# Altium footprint library PCB1.PcbLib: 98 footprints (part 4 of 7)
Each footprint in its own frame and in the unit in brackets; x right, y up, seen from the top. Pads: shape width x height; smd on the part's side, far side on the other; paste and mask are expansions set on the pad; w line width, h text height; cw(c..) or ccw(c..) is an arc to the next point about the centre after c.
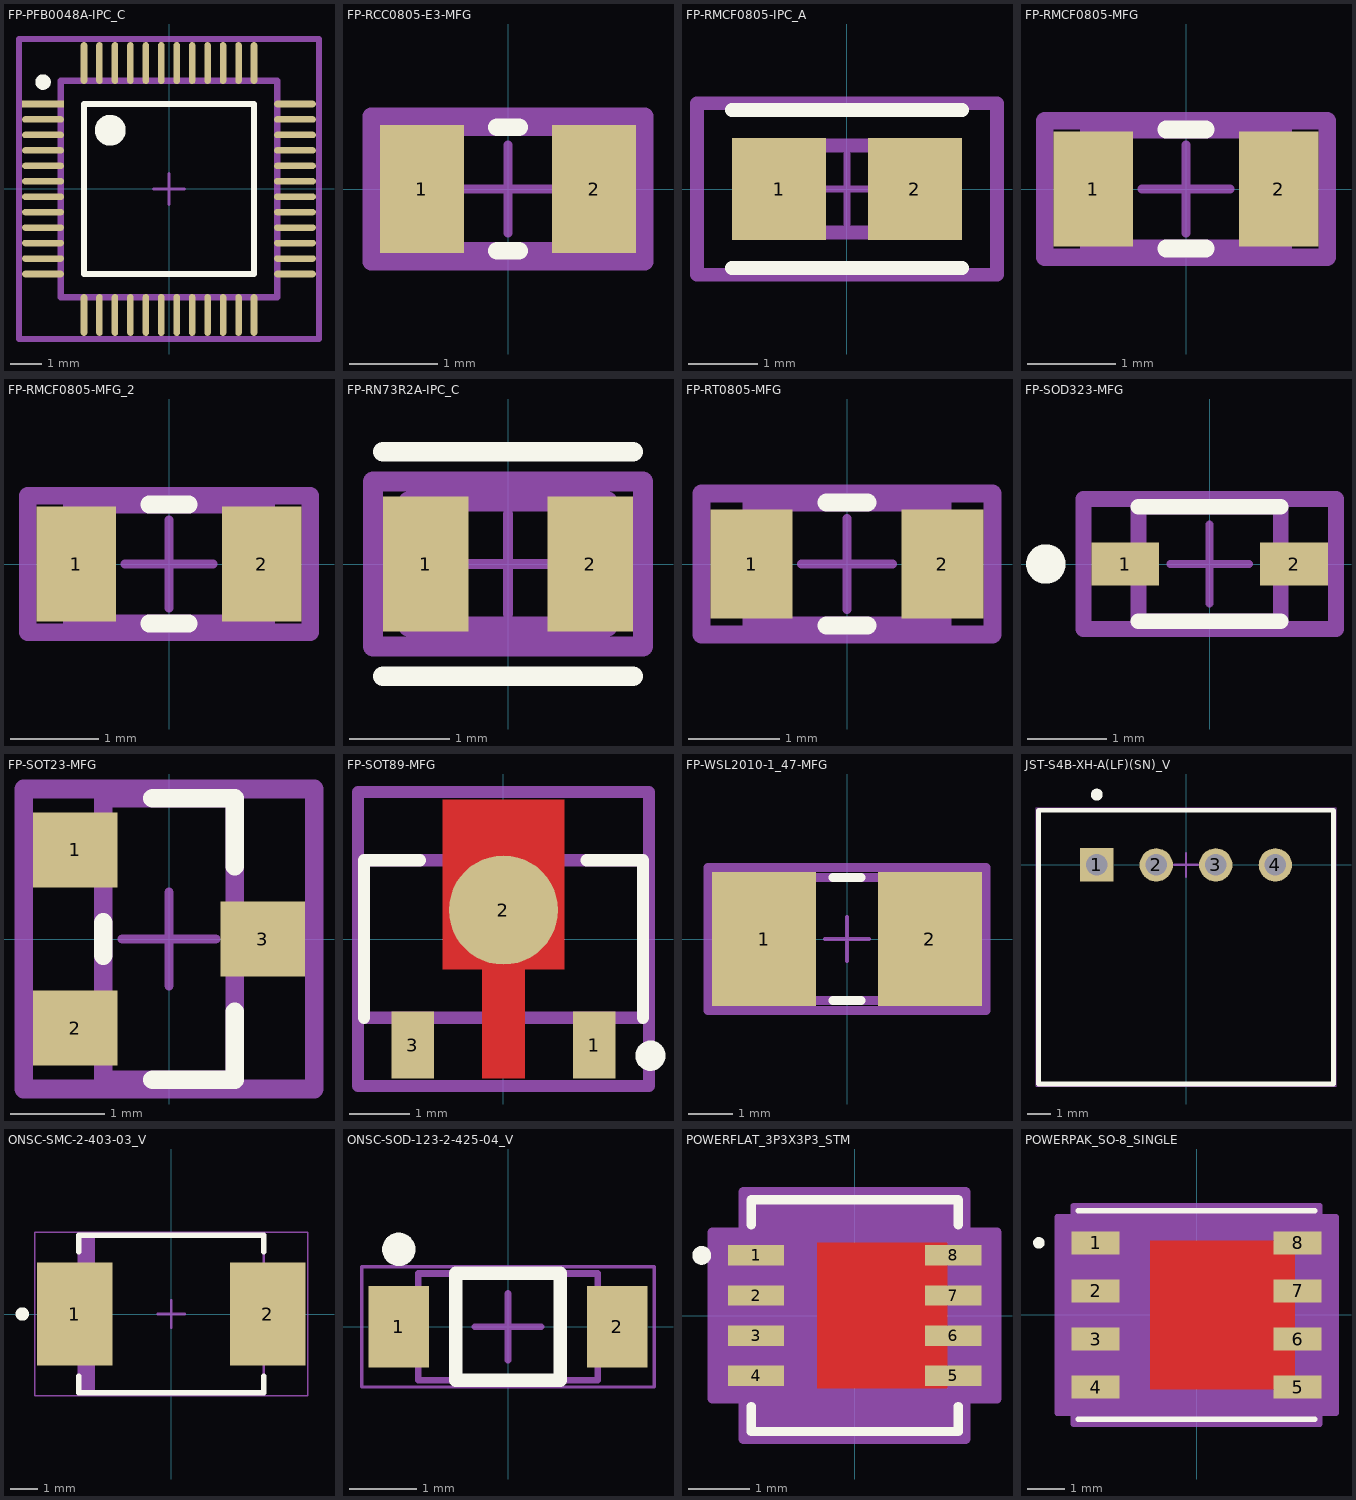
[diagram p3: the footprints below, top view; thin cyan lines are the x and y axes]

## FP-PFB0048A-IPC_C [mm]
pads (48):
  rect 1.355x0.212 smd paste+0 mask+0: 1(-4.075,2.75)
  rrect100% 1.355x0.212 smd paste+0 mask+0: 2(-4.075,2.25) 3(-4.075,1.75) 4(-4.075,1.25) 5(-4.075,0.75) 6(-4.075,0.25) 7(-4.075,-0.25) 8(-4.075,-0.75) 9(-4.075,-1.25) 10(-4.075,-1.75) 11(-4.075,-2.25) 12(-4.075,-2.75) 25(4.075,-2.75) 26(4.075,-2.25) 27(4.075,-1.75) 28(4.075,-1.25) 29(4.075,-0.75) 30(4.075,-0.25) 31(4.075,0.25) 32(4.075,0.75) 33(4.075,1.25) 34(4.075,1.75) 35(4.075,2.25) 36(4.075,2.75)
  rrect100% 0.212x1.355 smd paste+0 mask+0: 13(-2.75,-4.075) 14(-2.25,-4.075) 15(-1.75,-4.075) 16(-1.25,-4.075) 17(-0.75,-4.075) 18(-0.25,-4.075) 19(0.25,-4.075) 20(0.75,-4.075) 21(1.25,-4.075) 22(1.75,-4.075) 23(2.25,-4.075) 24(2.75,-4.075) 37(2.75,4.075) 38(2.25,4.075) 39(1.75,4.075) 40(1.25,4.075) 41(0.75,4.075) 42(0.25,4.075) 43(-0.25,4.075) 44(-0.75,4.075) 45(-1.25,4.075) 46(-1.75,4.075) 47(-2.25,4.075) 48(-2.75,4.075)
Top Overlay:
  circle w0.5: c-1.9,1.9 r0.25
  circle w0.25: c-4.075,3.46 r0.125
  lines w0.2: -2.75,-2.75 2.75,-2.75 2.75,2.75 -2.75,2.75 -2.75,-2.75
Top Assembly:
  lines w0.2: -4.853,-4.853 4.853,-4.853 4.853,4.853 -4.853,4.853 -4.853,-4.853
Top 3D Body:
  lines w0.2: -3.5,-3.5 3.5,-3.5 3.5,3.5 -3.5,3.5 -3.5,-3.5
Top Courtyard:
  lines w0.2: -4.853,-4.853 4.853,-4.853 4.853,4.853 -4.853,4.853 -4.853,-4.853
Top Component Center:
  lines w0.1: -0.5,0 0.5,0 ; 0,-0.5 0,0.5
3D body "IC_Texas_Instruments_PCM4220PFBR_eec.STEP": height 0.25, standoff 0, extent -4.853,-4.853 4.853,4.853

## FP-RCC0805-E3-MFG [mm]
pads (2):
  rect 0.95x1.45 smd paste+0 mask+0: 1(-0.975,0) 2(0.975,0)
Top Overlay:
  lines w0.2: -0.125,-0.7 0.125,-0.7 ; -0.125,0.7 0.125,0.7
Top Assembly:
  lines w0.2: -1.55,-0.825 1.55,-0.825 1.55,0.825 -1.55,0.825 -1.55,-0.825
Top 3D Body:
  lines w0.2: -1.1,-0.7 1.1,-0.7 1.1,0.7 -1.1,0.7 -1.1,-0.7
Top Courtyard:
  lines w0.2: -1.55,-0.825 1.55,-0.825 1.55,0.825 -1.55,0.825 -1.55,-0.825
Top Component Center:
  lines w0.1: -0.5,0 0.5,0 ; 0,-0.5 0,0.5
3D body "Res_Vishay_RCC08050000Z0EA_eec.STEP": height 0.5, standoff 0, extent -1,-0.625 1,0.625

## FP-RMCF0805-IPC_A [mm]
pads (2):
  rect 1.355x1.462 smd paste+0 mask+0: 1(-0.976,0) 2(0.976,0)
Top Overlay:
  lines w0.2: -1.653,-1.131 1.653,-1.131 ; -1.653,1.131 1.653,1.131
Top Assembly:
  lines w0.2: -2.153,-1.231 -2.153,1.231 2.153,1.231 2.153,-1.231 -2.153,-1.231
Top 3D Body:
  lines w0.2: -1,-0.625 -1,0.625 1,0.625 1,-0.625 -1,-0.625
Top Courtyard:
  lines w0.2: -2.153,-1.231 -2.153,1.231 2.153,1.231 2.153,-1.231 -2.153,-1.231
Top Component Center:
  lines w0.1: -0.5,0 0.5,0 ; 0,-0.5 0,0.5
3D body "Res_Stackpole_Electronics_RMCF0805JT220K_eec.STEP": height 0.25, standoff 0, extent -2.153,-1.231 2.153,1.231

## FP-RMCF0805-MFG [mm]
pads (2):
  rect 0.9x1.3 smd paste+0 mask+0: 1(-1.05,0) 2(1.05,0)
Top Overlay:
  lines w0.2: -0.225,-0.675 0.225,-0.675 ; -0.225,0.675 0.225,0.675
Top Assembly:
  lines w0.2: -1.6,-0.775 1.6,-0.775 1.6,0.775 -1.6,0.775 -1.6,-0.775
  text ".Designator" at 0,0.188 h1
Top 3D Body:
  lines w0.2: -1.1,-0.675 1.1,-0.675 1.1,0.675 -1.1,0.675 -1.1,-0.675
Top Courtyard:
  lines w0.2: -1.6,-0.775 1.6,-0.775 1.6,0.775 -1.6,0.775 -1.6,-0.775
Top Component Center:
  lines w0.1: -0.5,0 0.5,0 ; 0,-0.5 0,0.5
3D body "Res_Stackpole_Electronics_RMCF0805JT220K_eec.STEP": height 0.25, standoff 0, extent -1.6,-0.775 1.6,0.775

## FP-RMCF0805-MFG_2 [mm]
pads (2):
  rect 0.9x1.3 smd paste+0 mask+0: 1(-1.05,0) 2(1.05,0)
Top Overlay:
  lines w0.2: -0.225,-0.675 0.225,-0.675 ; -0.225,0.675 0.225,0.675
Top Assembly:
  lines w0.2: -1.6,-0.775 1.6,-0.775 1.6,0.775 -1.6,0.775 -1.6,-0.775
  text ".Designator" at 0,0.188 h1
Top 3D Body:
  lines w0.2: -1.1,-0.675 1.1,-0.675 1.1,0.675 -1.1,0.675 -1.1,-0.675
Top Courtyard:
  lines w0.2: -1.6,-0.775 1.6,-0.775 1.6,0.775 -1.6,0.775 -1.6,-0.775
Top Component Center:
  lines w0.1: -0.5,0 0.5,0 ; 0,-0.5 0,0.5
3D body "Res_Stackpole_Electronics_RMCF0805JT220K_eec.STEP": height 0.25, standoff 0, extent -1.6,-0.775 1.6,0.775

## FP-RN73R2A-IPC_C [mil]
pads (2):
  rect 33.67x53.39 smd paste+0 mask+0: 1(-32.5,0) 2(32.5,0)
Top Overlay:
  lines w7.87: -49.33,-44.29 49.33,-44.29 ; -49.33,44.29 49.33,44.29
Top Assembly:
  lines w7.87: -53.27,-32.48 53.27,-32.48 53.27,32.48 -53.27,32.48 -53.27,-32.48
Top 3D Body:
  lines w7.87: -39.37,-24.61 39.37,-24.61 39.37,24.61 -39.37,24.61 -39.37,-24.61
Top Courtyard:
  lines w7.87: -53.27,-32.48 53.27,-32.48 53.27,32.48 -53.27,32.48 -53.27,-32.48
Top Component Center:
  lines w3.94: -19.68,0 19.68,0 ; 0,-19.68 0,19.68
3D body "Res_KOA_Speer_RN73R2ATTD3611C25_eec.STEP": height 23.72, standoff 0, extent -39.37,-24.61 39.37,24.61

## FP-RT0805-MFG [mm]
pads (2):
  rect 0.9x1.2 smd paste+0 mask+0: 1(-1.05,0) 2(1.05,0)
Top Overlay:
  lines w0.2: -0.225,-0.675 0.225,-0.675 ; -0.225,0.675 0.225,0.675
Top Assembly:
  lines w0.2: -1.6,-0.775 1.6,-0.775 1.6,0.775 -1.6,0.775 -1.6,-0.775
Top 3D Body:
  lines w0.2: -1.05,-0.675 1.05,-0.675 1.05,0.675 -1.05,0.675 -1.05,-0.675
Top Courtyard:
  lines w0.2: -1.6,-0.775 1.6,-0.775 1.6,0.775 -1.6,0.775 -1.6,-0.775
Top Component Center:
  lines w0.1: -0.5,0 0.5,0 ; 0,-0.5 0,0.5
3D body "Res_Yageo_RT0805WRB07165RL_eec.STEP": height 0.25, standoff 0, extent -1.6,-0.775 1.6,0.775

## FP-SOD323-MFG [mm]
pads (2):
  rect 0.86x0.54 smd paste+0 mask+0: 1(-1.07,0) 2(1.07,0)
Top Overlay:
  circle w0.25: c-2.075,0 r0.125
  lines w0.2: -0.9,-0.725 0.9,-0.725 ; -0.9,0.725 0.9,0.725
Top Assembly:
  lines w0.2: -1.6,-0.825 -1.6,0.825 1.6,0.825 1.6,-0.825 -1.6,-0.825
Top 3D Body:
  lines w0.2: -0.9,-0.725 -0.9,0.725 0.9,0.725 0.9,-0.725 -0.9,-0.725
Top Courtyard:
  lines w0.2: -1.6,-0.825 -1.6,0.825 1.6,0.825 1.6,-0.825 -1.6,-0.825
Top Component Center:
  lines w0.1: -0.5,0 0.5,0 ; 0,-0.5 0,0.5
3D body "IC_STMicroelectronics_BAT54JFILM_eec.STEP": height 0.25, standoff 0, extent -1.6,-0.825 1.6,0.825

## FP-SOT23-MFG [mm]
pads (3):
  rect 0.9x0.8 smd paste+0 mask+0: 1(-1,0.95) 2(-1,-0.95) 3(1,0)
Top Overlay:
  lines w0.2: -0.7,-0.175 -0.7,0.175 ; -0.175,-1.5 0.7,-1.5 0.7,-0.775 ; -0.175,1.5 0.7,1.5 0.7,0.775
Top Assembly:
  lines w0.2: -1.55,-1.6 1.55,-1.6 1.55,1.6 -1.55,1.6 -1.55,-1.6
Top 3D Body:
  lines w0.2: -0.7,-1.5 0.7,-1.5 0.7,1.5 -0.7,1.5 -0.7,-1.5
Top Courtyard:
  lines w0.2: -1.55,-1.6 1.55,-1.6 1.55,1.6 -1.55,1.6 -1.55,-1.6
Top Component Center:
  lines w0.1: -0.5,0 0.5,0 ; 0,-0.5 0,0.5
3D body "Trans_Diodes_Inc_DMN10H220L-7_eec.STEP": height 0.25, standoff 0, extent -1.55,-1.6 1.55,1.6

## FP-SOT89-MFG [mm]
pads (3):
  rect 0.7x1.1 smd paste-1000 mask+0: 1(1.5,-1.75) 3(-1.5,-1.75)
  round 1.8 smd paste-1000 mask+0: 2(0,0.478)
Top Layer:
  region: -1,2.3 1,2.3 1,-0.5 0.35,-0.5 0.35,-2.3 -0.35,-2.3 -0.35,-0.5 -1,-0.5
Top Overlay:
  circle w0.25: c2.425,-1.925 r0.125
  lines w0.2: -2.3,-1.3 -2.3,1.3 -1.375,1.3 ; 1.375,1.3 2.3,1.3 2.3,-1.3
Top Paste:
  rectangle: -1.8,-2.25 -1.2,-1.25
  rectangle: 1.2,-2.25 1.8,-1.25
  rectangle: -0.3,-2.25 0.3,-1.25
  rectangle: -0.95,1.398 0.95,2.248
  rectangle: -0.6,0 0.6,1.2
Top Assembly:
  lines w0.2: -2.4,-2.425 2.4,-2.425 2.4,2.425 -2.4,2.425 -2.4,-2.425
Top 3D Body:
  lines w0.2: -2.3,-1.3 2.3,-1.3 2.3,1.3 -2.3,1.3 -2.3,-1.3
Top Courtyard:
  lines w0.2: -2.4,-2.425 2.4,-2.425 2.4,2.425 -2.4,2.425 -2.4,-2.425
Top Component Center:
  lines w0.1: -0.5,0 0.5,0 ; 0,-0.5 0,0.5
3D body "Trans_Nexperia_PBHV8115X_115_eec.STEP": height 0.25, standoff 0, extent -2.4,-2.425 2.4,2.425

## FP-WSL2010-1_47-MFG [mm]
pads (2):
  rect 2.36x3.05 smd paste+0 mask+0: 1(-1.88,0) 2(1.88,0)
Top Overlay:
  lines w0.2: -0.325,-1.397 0.325,-1.397 ; -0.325,1.397 0.325,1.397
Top Assembly:
  lines w0.2: -3.16,-1.625 -3.16,1.625 3.16,1.625 3.16,-1.625 -3.16,-1.625
Top 3D Body:
  lines w0.2: -2.667,-1.397 -2.667,1.397 2.667,1.397 2.667,-1.397 -2.667,-1.397
Top Courtyard:
  lines w0.2: -3.16,-1.625 -3.16,1.625 3.16,1.625 3.16,-1.625 -3.16,-1.625
Top Component Center:
  lines w0.1: -0.5,0 0.5,0 ; 0,-0.5 0,0.5
3D body "Res_Vishay_Dale_WSL20102L000FEA_eec.STEP": height 0.25, standoff 0, extent -3.16,-1.625 3.16,1.625

## JST-S4B-XH-A(LF)(SN)_V [mm]
pads (4):
  rect 1.4x1.4 hole 0.9: 1(-3.75,0)
  round 1.4 hole 0.9: 2(-1.25,0) 3(1.25,0) 4(3.75,0)
Top Overlay:
  circle w0.25: c-3.75,2.95 r0.125
  lines w0.2: -6.2,-9.2 6.2,-9.2 6.2,2.3 -6.2,2.3 -6.2,-9.2
Top 3D Body:
  lines w0.1: -6.2,-9.2 6.2,-9.2 6.2,2.3 -6.2,2.3 -6.2,-9.2
Top Courtyard:
  lines w0.05: -6.3,-9.3 6.3,-9.3 6.3,2.4 -6.3,2.4 -6.3,-9.3
  lines w0.1: -0.5,0 0.5,0 ; 0,-0.5 0,0.5
3D body "S4B-XH-A.STEP": height 6.15, standoff -3.4, extent -6.2,-9.2 6.2,2.3

## ONSC-SMC-2-403-03_V [mil]
pads (2):
  rect 110x150 smd: 1(-140.49,0) 2(140.49,0)
Top Overlay:
  circle w9.84: c-217.15,0 r4.92
  lines w7.87: -135.04,-90.75 -135.04,-114.96 135.04,-114.96 135.04,-90.75 ; -135.04,90.75 -135.04,114.96 135.04,114.96 135.04,90.75
Top 3D Body:
  rectangle: -135.45,-114.96 -111.25,114.96
  lines w3.94: -135.04,-114.96 135.04,-114.96 135.04,114.96 -135.04,114.96 -135.04,-114.96
Top Courtyard:
  lines w1.97: -199.43,-118.9 199.43,-118.9 199.43,118.9 -199.43,118.9 -199.43,-118.9
  lines w3.94: -19.68,0 19.69,0 ; 0,-19.68 0,19.68
3D body: height 99.02, standoff 1.97, extent -135.04,-114.96 135.04,114.96

## ONSC-SOD-123-2-425-04_V [mm]
pads (2):
  rect 0.91x1.22 smd: 1(-1.635,0) 2(1.635,0)
Top Overlay:
  circle w0.25: c-1.635,1.16 r0.125
  lines w0.2: -0.78,-0.8 0.78,-0.8 0.78,0.8 -0.78,0.8 -0.78,-0.8
Top 3D Body:
  lines w0.1: -1.345,-0.8 1.345,-0.8 1.345,0.8 -1.345,0.8 -1.345,-0.8
Top Courtyard:
  lines w0.05: -2.19,-0.9 2.19,-0.9 2.19,0.9 -2.19,0.9 -2.19,-0.9
  lines w0.1: -0.5,0 0.5,0 ; 0,-0.5 0,0.5
3D body: height 1.35, standoff 0, extent -1.345,-0.8 1.345,0.8

## POWERFLAT_3P3X3P3_STM [mm]
pads (8):
  rect 0.91x0.331 smd paste+0 mask+0: 1(-1.598,0.975) 2(-1.598,0.325) 3(-1.598,-0.325) 4(-1.598,-0.975) 5(1.598,-0.975) 6(1.598,-0.325) 7(1.598,0.325) 8(1.598,0.975)
Top Layer:
  region: 1.499,-1.181 1.499,1.181 -0.61,1.181 -0.61,-1.181
Top Overlay:
  circle w0.152: c-2.479,0.975 r0.076
  lines w0.152: -1.676,-1.473 -1.676,-1.88 1.676,-1.88 1.676,-1.473 ; -1.676,1.473 -1.676,1.88 1.676,1.88 1.676,1.473
Top Paste:
  region: 1.499,-1.181 1.499,1.181 -0.61,1.181 -0.61,-1.181
Top Solder:
  region: 1.499,-1.181 1.499,1.181 -0.61,1.181 -0.61,-1.181
Top 3D Body:
  circle w0: c-1.143,0.975 r0.076
  lines w0: -0.305,1.753 ccw(c0,1.753) 0.305,1.753
  lines w0.025: -1.549,-1.753 -1.549,1.753 1.549,1.753 1.549,-1.753 -1.549,-1.753
Top Courtyard:
  region: -1.803,-1.351 -2.307,-1.351 -2.307,1.351 -1.803,1.351 -1.803,2.007 1.803,2.007 1.803,1.351 2.307,1.351 2.307,-1.351 1.803,-1.351 1.803,-2.007 -1.803,-2.007
  lines w0.152: -2.307,-1.351 -1.803,-1.351 -1.803,-2.007 1.803,-2.007 1.803,-1.351 2.307,-1.351 2.307,1.351 1.803,1.351 1.803,2.007 -1.803,2.007 -1.803,1.351 -2.307,1.351 -2.307,-1.351
3D body "POWERFLAT_3P3X3P3_STM.step": height 0.89, standoff 0, extent -1.753,-1.753 1.753,1.753

## POWERPAK_SO-8_SINGLE [mil]
pads (8):
  rect 50x24 smd paste-24.5 mask-25: 1(-105,75) 2(-105,25) 3(-105,-25) 4(-105,-75) 5(105,-75) 6(105,-25) 7(105,25) 8(105,75)
Top Layer:
  region: -48,-77 -48,77 102,77 102,-77
Top Overlay:
  circle w6: c-164,75 r3
  lines w6: -123,-108.5 123,-108.5 ; -123,108.5 123,108.5
Top Paste:
  region: -1.94,73.06 -44.06,73.06 -44.06,29.6 -1.94,29.6
  region: -1.94,21.73 -44.06,21.73 -44.06,-21.73 -1.94,-21.73
  region: -1.94,-29.6 -44.06,-29.6 -44.06,-73.06 -1.94,-73.06
  region: 48.06,73.06 5.94,73.06 5.94,29.6 48.06,29.6
  region: 48.06,21.73 5.94,21.73 5.94,-21.73 48.06,-21.73
  region: 48.06,-29.6 5.94,-29.6 5.94,-73.06 48.06,-73.06
  region: 98.06,73.06 55.94,73.06 55.94,29.6 98.06,29.6
  region: 98.06,21.73 55.94,21.73 55.94,-21.73 98.06,-21.73
  region: 98.06,-29.6 55.94,-29.6 55.94,-73.06 98.06,-73.06
  region: -80,87 -130,87 -130,63 -80,63
  region: -80,37 -130,37 -130,13 -80,13
  region: -80,-13 -130,-13 -130,-37 -80,-37
  region: -80,-63 -130,-63 -130,-87 -80,-87
  region: 130,-63 80,-63 80,-87 130,-87
  region: 130,-13 80,-13 80,-37 130,-37
  region: 130,37 80,37 80,13 130,13
  region: 130,87 80,87 80,63 130,63
Top Solder:
  region: -48,-77 -48,77 102,77 102,-77
Top 3D Body:
  circle w1: c-85,75 r3
  lines w1: -12,103.5 ccw(c0,103.5) 12,103.5 ; -118,-103.5 118,-103.5 118,103.5 -118,103.5 -118,-103.5
Top Courtyard:
  region: -128,-102 -145,-102 -145,102 -128,102 -128,113.5 128,113.5 128,102 145,102 145,-102 128,-102 128,-113.5 -128,-113.5
  lines w6: -145,-102 -145,102 -128,102 -128,113.5 128,113.5 128,102 145,102 145,-102 128,-102 128,-113.5 -128,-113.5 -128,-102 -145,-102
3D body "SIR426DP-T1-GE3.STEP": height 44, standoff 0, extent -121,-100 121,103